# Altium footprint library ie-track-kit-arduino-1.PcbLib: 53 footprints (part 4 of 4)
Each footprint in its own frame and in the unit in brackets; x right, y up, seen from the top. Pads: shape width x height; smd on the part's side, far side on the other; paste and mask are expansions set on the pad; w line width, h text height; cw(c..) or ccw(c..) is an arc to the next point about the centre after c.
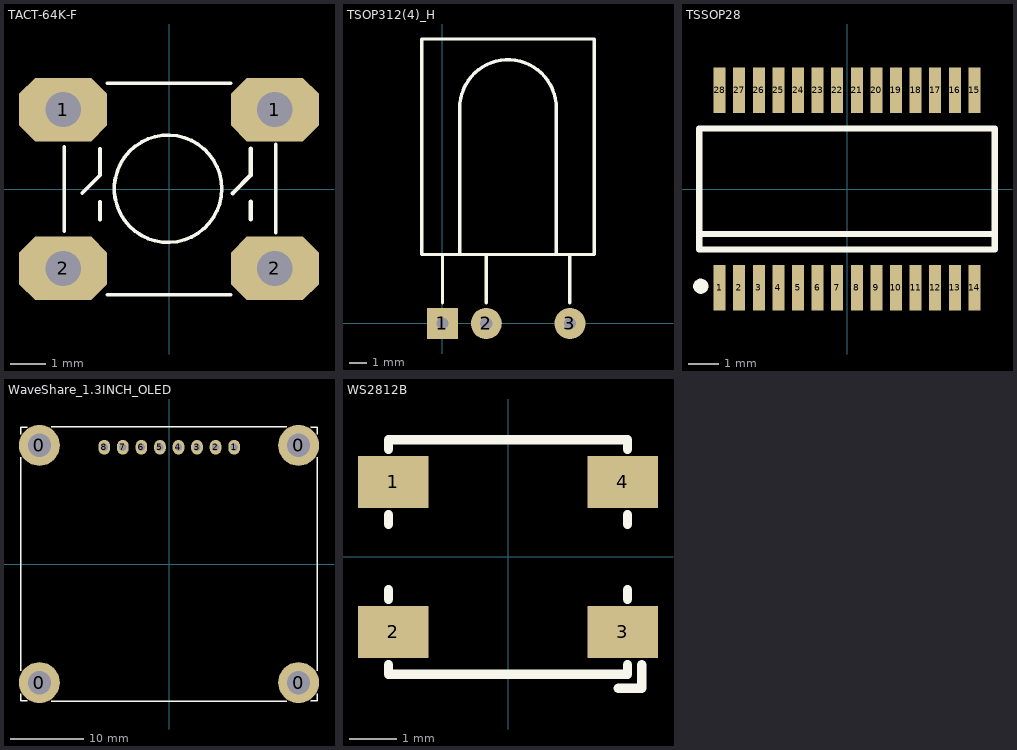
[diagram p3: the footprints below, top view; thin cyan lines are the x and y axes]

## TACT-64K-F [mm]
height 9.45
pads (4):
  oct 2.5x1.8 hole 1: 1(-3,2.25) 1(3,2.25) 2(-3,-2.25) 2(3,-2.25)
Top Overlay:
  circle w0.102: c-0.029,0.007 r1.521
  lines w0.102: -2.972,-1.194 -2.972,1.194 ; -2.456,-0.114 -1.956,0.386 -1.956,1.136 ; -1.956,-0.864 -1.956,-0.364 ; -1.75,-3 1.75,-3 ; -1.75,3 1.75,3 ; 3.023,-1.245 3.023,1.27
  lines w0.127: 1.811,-0.114 2.311,0.386 2.311,1.136 ; 2.311,-0.864 2.311,-0.364
3D body "User Library-TPxxxx (Switch).step": height 4.9, standoff -3.59, extent -4.005,-3.018 3.969,2.982

## TSOP312(4)_H [mm]
pads (3):
  rect 1.8x1.8 hole 0.7: 1(0,0)
  round 1.8 hole 0.7: 2(2.54,0) 3(7.392,0)
Top Overlay:
  lines w0.2: 0,1.2 0,4 ; 2.54,1.2 2.54,4 ; 7.392,1.2 7.392,4 ; 1,4 6.6,4 ; 1,4 1,12.5 cw(c3.8,12.5) 6.6,12.5 6.6,4 ; 1,4 -1.2,4 -1.2,16.5 8.8,16.5 8.8,4 6.6,4
3D body "User Library-TSOP1238_2009.step": height 5.95, standoff -2, extent -1.2,-0.2 8.8,16.5

## TSSOP28 [mm] "JEDEC MO-153 AE (TSSOP-28)"
height 2
pads (28):
  rect 0.4x1.5 smd: 1(-4.225,-3.275) 2(-3.575,-3.275) 3(-2.925,-3.275) 4(-2.275,-3.275) 5(-1.625,-3.275) 6(-0.975,-3.275) 7(-0.325,-3.275) 8(0.325,-3.275) 9(0.975,-3.275) 10(1.625,-3.275) 11(2.275,-3.275) 12(2.925,-3.275) 13(3.575,-3.275) 14(4.225,-3.275) 15(4.225,3.275) 16(3.575,3.275) 17(2.925,3.275) 18(2.275,3.275) 19(1.625,3.275) 20(0.975,3.275) 21(0.325,3.275) 22(-0.325,3.275) 23(-0.975,3.275) 24(-1.625,3.275) 25(-2.275,3.275) 26(-2.925,3.275) 27(-3.575,3.275) 28(-4.225,3.275)
Top Overlay:
  circle w0.25: c-4.85,-3.225 r0.125
  lines w0.2: -4.9,-1.5 4.9,-1.5 ; -4.9,-2 -4.9,2 4.9,2 4.9,-2 -4.9,-2
3D body "User Library-JEDEC MO-153 (TSSOP) (7).step": height 1.2, standoff 0, extent -4.85,-3.228 4.85,3.228

## WaveShare_1.3INCH_OLED [mm]
height 5.8
pads (12):
  round 5.6 hole 3.2: 0(-17.75,-16.25) 0(-17.75,16.25) 0(17.75,-16.25) 0(17.75,16.25)
  oval 1.6x2 hole 1: 1(8.92,16) 2(6.38,16) 3(3.84,16) 4(1.3,16) 5(-1.24,16) 6(-3.78,16) 7(-6.32,16) 8(-8.86,16)
Top Overlay:
  lines w0.2: -20.32,-17.78 -20.32,-18.75 -20.25,-18.75 -19.431,-18.75 ; -20.32,-14.605 -20.32,14.605 ; -20.32,17.78 -20.32,18.75 -20.25,18.75 -19.431,18.75 ; -16.129,-18.796 16.129,-18.796 ; -16.129,18.796 16.129,18.796 ; 19.431,-18.75 20.25,-18.75 20.32,-18.75 20.32,-17.78 ; 19.431,18.75 20.25,18.75 20.32,18.75 20.32,17.78 ; 20.32,-14.605 20.32,14.605
3D body: height 2.2, standoff 1.2, extent -20.32,-18.77 20.32,18.77

## WS2812B [mm] "WS2812B Addressable RGB LED"
height 1
pads (4):
  rect 1.5x1.1 smd: 1(-2.45,1.6) 2(-2.45,-1.6) 3(2.45,-1.6) 4(2.45,1.6)
Top Overlay:
  lines w0.2: -2.55,-2.3 -2.55,-2.5 2.55,-2.5 2.55,-2.3 ; -2.55,-0.9 -2.55,-0.7 ; -2.55,0.7 -2.55,0.9 ; -2.55,2.3 -2.55,2.5 2.55,2.5 2.55,2.3 ; 0.65,-2.5 1.35,-2.5 ; 2.35,-2.8 2.85,-2.8 2.85,-2.7 2.85,-2.3 ; 2.55,-0.9 2.55,-0.7 ; 2.55,0.7 2.55,0.9
3D body "5050B.STEP": height 1.6, standoff 0, extent -2.65,-2.5 2.65,2.5